# Altium footprint library RPSLib_Connectors.PcbLib: 85 footprints (part 6 of 6)
Each footprint in its own frame and in the unit in brackets; x right, y up, seen from the top. Pads: shape width x height; smd on the part's side, far side on the other; paste and mask are expansions set on the pad; w line width, h text height; cw(c..) or ccw(c..) is an arc to the next point about the centre after c.
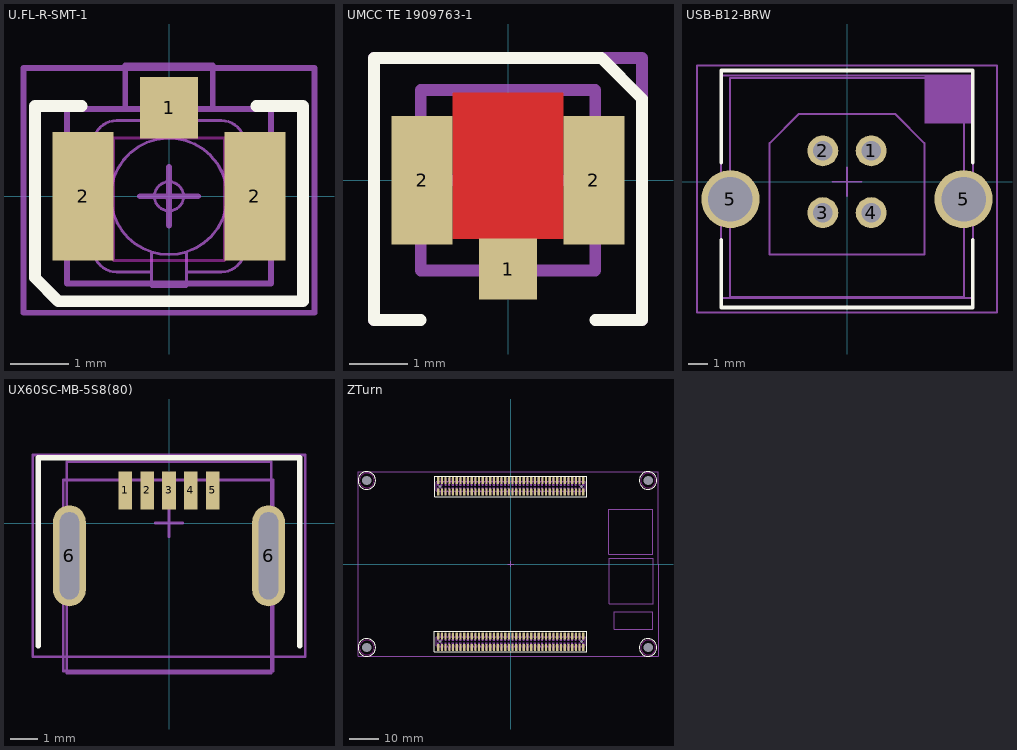
[diagram p5: the footprints below, top view; thin cyan lines are the x and y axes]

## U.FL-R-SMT-1 [mm] "U.FL SMD connector"
height 1.25
pads (3):
  rect 1x1.05 smd mask+0.07: 1(0,1.52)
  rect 1.05x2.2 smd mask+0.07: 2(-1.475,0) 2(1.475,0)
Top Layer keep-out:
  lines w0.05: -0.95,-1.1 -0.95,1 0.95,1 0.95,-1.1 -0.95,-1.1
Top Overlay:
  lines w0.2: -1.5,1.55 -2.3,1.55 -2.3,-1.4 -1.9,-1.8 2.3,-1.8 2.3,1.55 1.5,1.55
Top Designator:
  lines w0.1: -0.75,1.5 -0.75,2.25 0.75,2.25 0.75,1.5 ; -1.75,-1.5 1.75,-1.5 1.75,1.5 -1.75,1.5 -1.75,-1.5
  text ".Designator" at -2.868,-0.271 h1.2
Top Courtyard:
  lines w0.1: -0.5,0 0.5,0 ; 0,-0.5 0,0.5
Top 3D Body:
  circle w0.05: c0,0 r0.05
  lines w0.05: -0.3,-1.3 -0.9,-1.3 cw(c-0.9,-0.9) -1.3,-0.9 ; -0.3,1.3 -0.3,1.55 0.3,1.55 0.3,1.3 ; 0.3,-1.3 0.9,-1.3 ccw(c0.9,-0.9) 1.3,-0.9 ; -1.3,-0.9 -1.5,-0.9 -1.5,0.9 -1.3,0.9 ; -1.3,-0.9 -1.3,0.9 ; -1.3,0.9 cw(c-0.9,0.9) -0.9,1.3 0.9,1.3 cw(c0.9,0.9) 1.3,0.9 ; -0.3,-0.954 cw(c0,0) -1,0 cw(c0,0) 0.3,-0.954 ; -0.3,-0.954 ccw(c0,0) 0.3,-0.954 ; -0.3,-0.954 -0.3,-1.55 0.3,-1.55 0.3,-0.954 ; 1.3,-0.9 1.5,-0.9 1.5,0.9 1.3,0.9 ; 1.3,-0.9 1.3,0.9 ; -0.25,0 ccw(c0,0) 0.25,0 ccw(c0,0) -0.25,0
22:
  lines w0.1: -2.5,-2 2.5,-2 2.5,2.2 -2.5,2.2 -2.5,-2
3D body "U.FL-R-SMT-1.stp": height 1.25, standoff 0, extent -1.5,-1.55 1.5,1.55

## UMCC TE 1909763-1 [mm]
height 1.25
pads (3):
  rect 1x1.05 smd mask+0.07: 1(0,-1.525)
  rect 1.05x2.2 smd mask+0.07: 2(-1.475,0) 2(1.475,0)
Top Layer:
  pour cut-out: -0.95,-1 -0.95,1.5 0.95,1.5 0.95,-1
Top Overlay:
  lines w0.2: -1.5,-2.4 -2.3,-2.4 -2.3,2.1 1.6,2.1 2.3,1.4 2.3,-2.4 1.5,-2.4
Top Designator:
  text ".Designator" at -2.868,-0.271 h1.2
Top Courtyard:
  lines w0.2: -2.3,-2.4 -2.3,2.1 2.3,2.1 2.3,-2.4 ; -1,0 1,0 ; 0,-1 0,1
Top 3D Body:
  lines w0.2: -1.5,-1.55 -1.5,1.55 1.5,1.55 1.5,-1.55 -1.5,-1.55
3D body "С-1909763-1.stp": height 1.23, standoff 0, extent -1.5,-1.55 1.5,1.55

## USB-B12-BRW [mm] "USB-B Vertical connector"
height 16.1
pads (6):
  round 1.6 hole 1 mask+0.07: 1(1.25,1.6) 2(-1.25,1.6) 3(-1.25,-1.6) 4(1.25,-1.6)
  round 3 hole 2.3 mask+0.07: 5(-6.02,-0.9) 5(6.02,-0.9)
Top Overlay:
  lines w0.2: -6.5,-3 -6.5,-6.5 6.5,-6.5 6.5,-3 ; -6.5,1 -6.5,5.75 6.5,5.75 6.5,1
Top Designator:
  rectangle: 4,3 6.5,5.5
  lines w0.1: -6.5,-6 6.5,-6 6.5,5.5 -6.5,5.5 -6.5,-6
  text ".Designator" at -2.868,-0.271 h1.2
Top Courtyard:
  lines w0.1: -0.75,0 0.75,0 ; 0,-0.75 0,0.75 ; -7.75,-6.75 7.75,-6.75 7.75,6 -7.75,6 -7.75,-6.75
Top 3D Body:
  lines w0.1: -6.045,-5.95 6.055,-5.95 6.055,5.35 -6.045,5.35 -6.045,-5.95 ; -4,-3.75 4,-3.75 4,2 2.5,3.5 -2.5,3.5 -4,2 -4,-3.75
20:
  text ".Designator" at -2.253,-0.226 h1
3D body "USB-B12-BRW.stp": height 16.05, standoff -4, extent -7.345,-5.95 7.355,5.35

## UX60SC-MB-5S8(80) [mm]
height 4
pads (7):
  rect 0.5x1.4 smd mask+0.07: 1(-1.6,1.2) 2(-0.8,1.2) 3(0,1.2) 4(0.8,1.2) 5(1.6,1.2)
  oval 1.2x3.7 hole 0.7 slot 3.2 at 90 deg mask+0.07: 6(-3.65,-1.2) 6(3.65,-1.2)
Top Overlay:
  lines w0.2: -4.8,-4.5 -4.8,2.4 4.8,2.4 4.8,-4.5
Top Designator:
  lines w0.1: -3.75,-5.5 -3.75,2.25 3.75,2.25 3.75,-5.5 -3.75,-5.5
  text ".Designator" at -2.868,-0.271 h1.2
Top Courtyard:
  lines w0.1: -0.5,0 0.5,0 ; 0,-0.5 0,0.5 ; -5,-4.9 -5,2.5 5,2.5 5,-4.9 -5,-4.9
Top 3D Body:
  lines w0.1: -3.875,-5.421 -3.875,1.579 3.825,1.579 3.825,-5.421 -3.875,-5.421
20:
  text ".Designator" at -1.126,-0.113 h0.5
3D body "UX60SC-MB-5S8.stp": height 3.9, standoff -0.8, extent -3.875,-5.421 3.825,1.579

## ZTurn [mm]
pads (168):
  rect 0.75x2.4 smd mask+0.07: A1(-24.765,-24.55) A2(-24.765,-28.45) A3(-23.495,-24.55) A4(-23.495,-28.45) A5(-22.225,-24.55) A6(-22.225,-28.45) A7(-20.955,-24.55) A8(-20.955,-28.45) A9(-19.685,-24.55) A10(-19.685,-28.45) A11(-18.415,-24.55) A12(-18.415,-28.45) A13(-17.145,-24.55) A14(-17.145,-28.45) A15(-15.875,-24.55) A16(-15.875,-28.45) A17(-14.605,-24.55) A18(-14.605,-28.45) A19(-13.335,-24.55) A20(-13.335,-28.45) A21(-12.065,-24.55) A22(-12.065,-28.45) A23(-10.795,-24.55) A24(-10.795,-28.45) A25(-9.525,-24.55) A26(-9.525,-28.45) A27(-8.255,-24.55) A28(-8.255,-28.45) A29(-6.985,-24.55) A30(-6.985,-28.45) A31(-5.715,-24.55) A32(-5.715,-28.45) A33(-4.445,-24.55) A34(-4.445,-28.45) A35(-3.175,-24.55) A36(-3.175,-28.45) A37(-1.905,-24.55) A38(-1.905,-28.45) A39(-0.635,-24.55) A40(-0.635,-28.45) A41(0.635,-24.55) A42(0.635,-28.45) A43(1.905,-24.55) A44(1.905,-28.45) A45(3.175,-24.55) A46(3.175,-28.45) A47(4.445,-24.55) A48(4.445,-28.45) A49(5.715,-24.55) A50(5.715,-28.45) A51(6.985,-24.55) A52(6.985,-28.45) A53(8.255,-24.55) A54(8.255,-28.45) A55(9.525,-24.55) A56(9.525,-28.45) A57(10.795,-24.55) A58(10.795,-28.45) A59(12.065,-24.55) A60(12.065,-28.45) A61(13.335,-24.55) A62(13.335,-28.45) A63(14.605,-24.55) A64(14.605,-28.45) A65(15.875,-24.55) A66(15.875,-28.45) A67(17.145,-24.55) A68(17.145,-28.45) A69(18.415,-24.55) A70(18.415,-28.45) A71(19.685,-24.55) A72(19.685,-28.45) A73(20.955,-24.55) A74(20.955,-28.45) A75(22.225,-24.55) A76(22.225,-28.45) A77(23.495,-24.55) A78(23.495,-28.45) A79(24.765,-24.55) A80(24.765,-28.45) B1(-24.765,28.45) B2(-24.765,24.55) B3(-23.495,28.45) B4(-23.495,24.55) B5(-22.225,28.45) B6(-22.225,24.55) B7(-20.955,28.45) B8(-20.955,24.55) B9(-19.685,28.45) B10(-19.685,24.55) B11(-18.415,28.45) B12(-18.415,24.55) B13(-17.145,28.45) B14(-17.145,24.55) B15(-15.875,28.45) B16(-15.875,24.55) B17(-14.605,28.45) B18(-14.605,24.55) B19(-13.335,28.45) B20(-13.335,24.55) B21(-12.065,28.45) B22(-12.065,24.55) B23(-10.795,28.45) B24(-10.795,24.55) B25(-9.525,28.45) B26(-9.525,24.55) B27(-8.255,28.45) B28(-8.255,24.55) B29(-6.985,28.45) B30(-6.985,24.55) B31(-5.715,28.45) B32(-5.715,24.55) B33(-4.445,28.45) B34(-4.445,24.55) B35(-3.175,28.45) B36(-3.175,24.55) B37(-1.905,28.45) B38(-1.905,24.55) B39(-0.635,28.45) B40(-0.635,24.55) B41(0.635,28.45) B42(0.635,24.55) B43(1.905,28.45) B44(1.905,24.55) B45(3.175,28.45) B46(3.175,24.55) B47(4.445,28.45) B48(4.445,24.55) B49(5.715,28.45) B50(5.715,24.55) B51(6.985,28.45) B52(6.985,24.55) B53(8.255,28.45) B54(8.255,24.55) B55(9.525,28.45) B56(9.525,24.55) B57(10.795,28.45) B58(10.795,24.55) B59(12.065,28.45) B60(12.065,24.55) B61(13.335,28.45) B62(13.335,24.55) B63(14.605,28.45) B64(14.605,24.55) B65(15.875,28.45) B66(15.875,24.55) B67(17.145,28.45) B68(17.145,24.55) B69(18.415,28.45) B70(18.415,24.55) B71(19.685,28.45) B72(19.685,24.55) B73(20.955,28.45) B74(20.955,24.55) B75(22.225,28.45) B76(22.225,24.55) B77(23.495,28.45) B78(23.495,24.55) B79(24.765,28.45) B80(24.765,24.55)
  round 0 hole 1 unplated mask+0.07: mh0(-24.13,-26.5) MH0(-24.13,26.5) MH0(24.13,-26.5) MH0(24.13,26.5)
  round 0 hole 3.2 unplated mask+0.07: mh1(-49.13,28.5) mh2(-49.13,-28.5) mh3(46.87,28.5) mh4(46.87,-28.5)
Top Overlay:
  circle w0.2: c46.87,-28.5 r3
  circle w0.2: c46.87,28.5 r3
  circle w0.2: c-49.13,28.5 r3
  circle w0.2: c-49.13,-28.5 r3
  lines w0.2: -26.044,-29.976 -26.044,-22.976 25.956,-22.976 25.956,-29.976 -26.044,-29.976 ; -26,23 -26,30 26,30 26,23 -26,23
Keep-Out Layer:
  circle w0.254: c46.87,-28.5 r2.5
  circle w0.254: c46.87,28.5 r2.5
  circle w0.254: c-49.13,28.5 r2.5
  circle w0.254: c-49.13,-28.5 r2.5
Top Designator:
  text ".Designator" at -2.868,-0.271 h1.2
Top Courtyard:
  lines w0.1: -1,0 1,0 ; 0,-1 0,1 ; -52.13,-31.5 50.25,-31.5 50.25,31.5 -52.13,31.5 -52.13,-31.5
Top 3D Body:
  drawing of 1616 lines, arcs and shapes, not listed
  text "Ehternet" at 47.63,7.96 h2
  text "HDMI" at 47.742,-7.633 h2
  text "PWR" at 47.985,-21.256 h2
3D body "20021121-00080T4LF_ZTurn.stp": height 22.23, standoff -1, extent -52.13,-31.5 50.155,31.5